# Altium footprint library Sajad_Altium_Library.PcbLib: 333 footprints (part 17 of 21)
Each footprint in its own frame and in the unit in brackets; x right, y up, seen from the top. Pads: shape width x height; smd on the part's side, far side on the other; paste and mask are expansions set on the pad; w line width, h text height; cw(c..) or ccw(c..) is an arc to the next point about the centre after c.
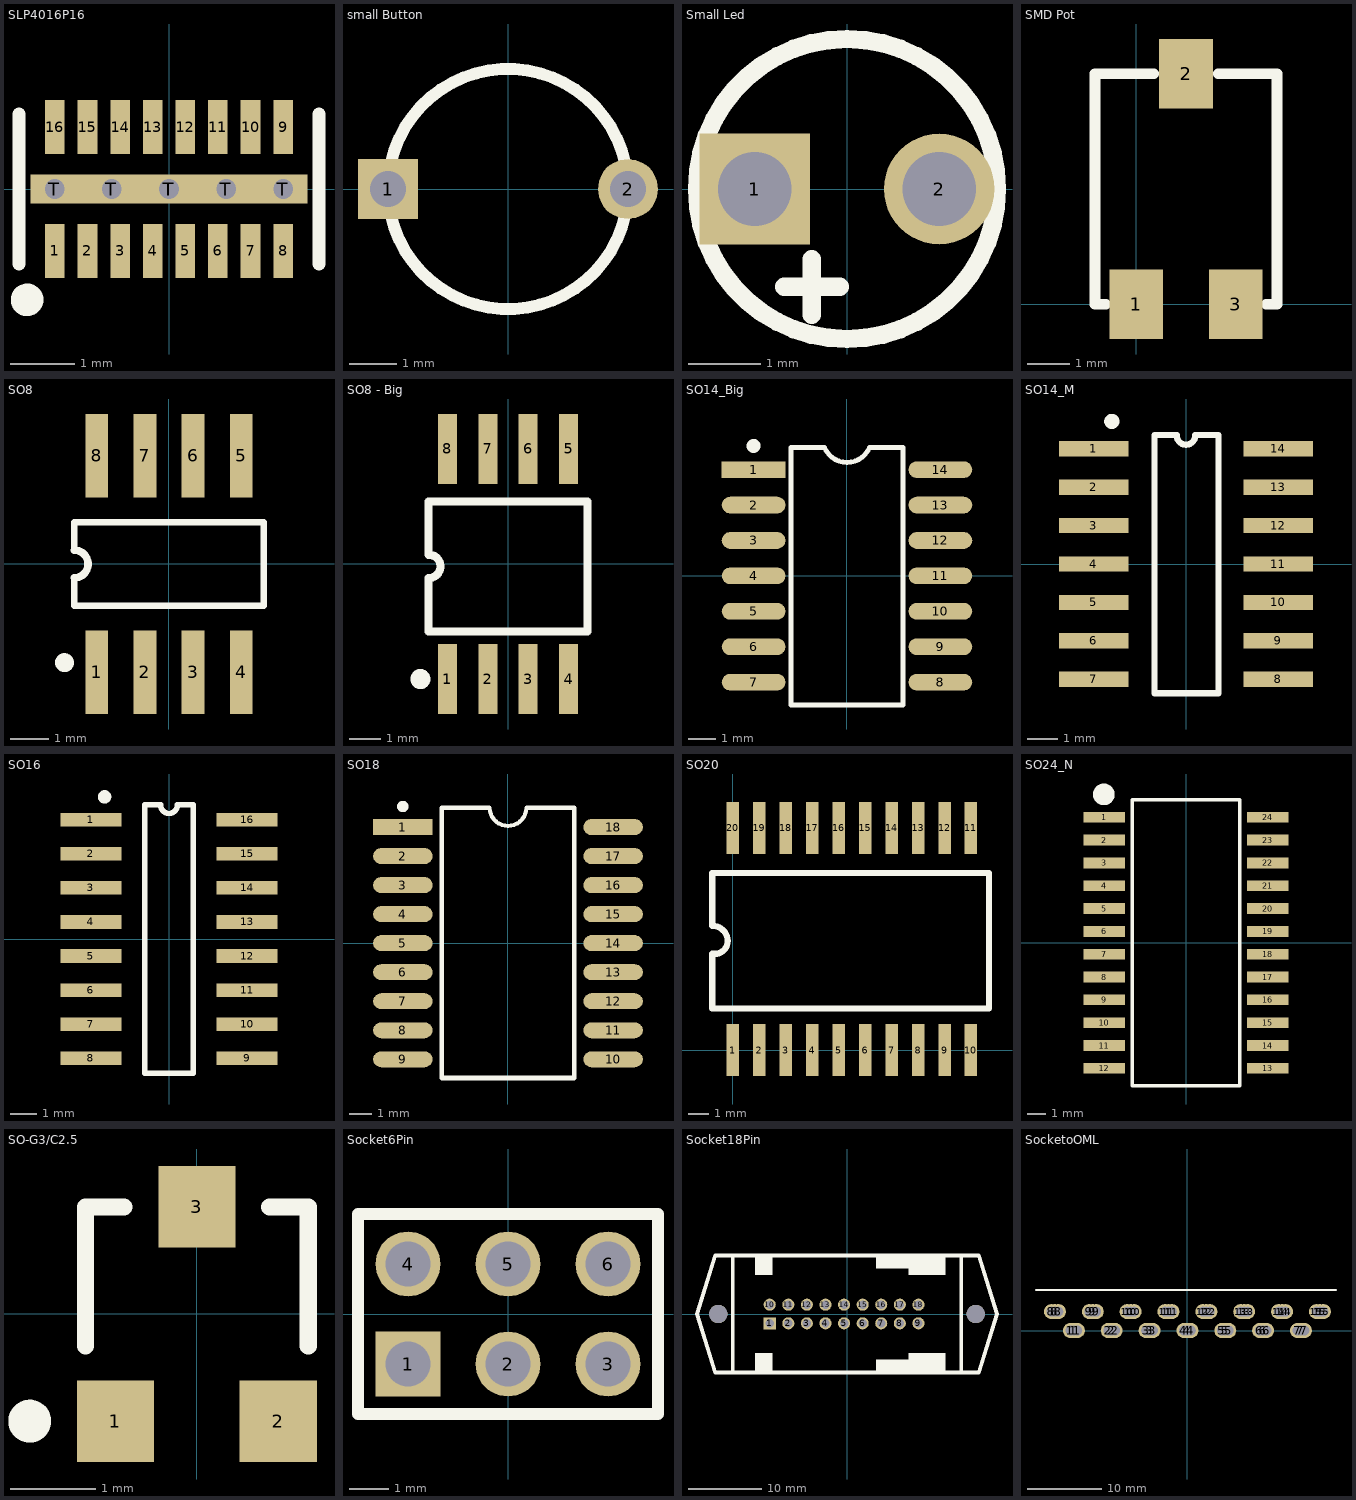
[diagram p16: the footprints below, top view; thin cyan lines are the x and y axes]

## SLP4016P16 [mil] "EClamp2410P  ESD Protection Device   for T-Flash/MicroSD Interfaces"
pads (22):
  rect 12x33 smd mask+2: 1(-70,-38) 2(-50,-38) 3(-30,-38) 4(-10,-38) 5(10,-38) 6(30,-38) 7(50,-38) 8(70,-38) 9(70,38) 10(50,38) 11(30,38) 12(10,38) 13(-10,38) 14(-30,38) 15(-50,38) 16(-70,38)
  round 15 hole 12 mask+2: T(-70,0) T(-35,0) T(0,0) T(35,0) T(70,0)
  rect 170x18 smd mask+2: T(0,0)
Top Overlay:
  circle w10: c-87,-68 r5
  lines w8: -92,-46 -92,46 ; 92,-46 92,46

## small Button [mil]
pads (2):
  rect 50x50 hole 30: 1(-100,0)
  round 50 hole 30: 2(100,0)
Top Overlay:
  circle w10: c0,0 r100
3D body: height 196.85, standoff -551.18, extent -118.1,-118.1 118.12,125.99

## Small Led [mil]
pads (2):
  rect 60x60 hole 40: 1(-50,0)
  round 60 hole 40: 2(50,0)
Top Overlay:
  circle w10: c0,0 r81.34
  lines w10: -34,-53 -3.88,-53 ; -19,-68.12 -19,-38
3D body: height 401.57, standoff -787.4, extent -64.29,-77.48 74.29,80

## SMD Pot [mil] "SMD Potentiometer"
pads (3):
  rect 50x65 smd: 1(0,0) 2(46.5,215) 3(93,0)
Top Overlay:
  lines w10: -28.5,0 -38.5,0 -38.5,215 16.5,215 ; 76.5,215 131.5,215 131.5,0 121.5,0
3D body: height 125.98, standoff -1.97, extent -32.68,-38.69 132.68,238.71

## SO8 [mm]
pads (8):
  rect 0.6x2.2 smd: 1(-1.905,-2.854) 2(-0.635,-2.854) 3(0.635,-2.854) 4(1.905,-2.854) 5(1.905,2.854) 6(0.635,2.854) 7(-0.635,2.854) 8(-1.905,2.854)
Top Overlay:
  circle w0.25: c-2.755,-2.6 r0.125
  lines w0.178: -2.5,-0.367 -2.5,-1.1 2.5,-1.1 2.5,1.1 -2.5,1.1 -2.5,0.367
  lines w0.2: -2.5,-0.367 ccw(c-2.5,0) -2.5,0.367
3D body: height 1.45, standoff 0, extent -2.464,-2.794 2.438,2.984

## SO8 - Big [mm]
pads (8):
  rect 0.6x2.2 smd: 1(-1.905,-3.619) 2(-0.635,-3.619) 3(0.635,-3.619) 4(1.905,-3.619) 5(1.905,3.619) 6(0.635,3.619) 7(-0.635,3.619) 8(-1.905,3.619)
Top Overlay:
  circle w0.381: c-2.755,-3.619 r0.125
  lines w0.254: -2.5,-0.442 -2.5,-2.119 2.5,-2.119 2.5,1.968 -2.5,1.968 -2.5,0.291 ; -2.489,-0.442 ccw(c-2.489,-0.075) -2.489,0.291
3D body: height 1.45, standoff 0, extent -2.451,-2.921 2.451,2.857

## SO14_Big [mm]
height 1.75
pads (14):
  rect 2.286x0.6 smd: 1(-3.35,3.81)
  oval 2.286x0.6 smd: 2(-3.35,2.54) 3(-3.35,1.27) 4(-3.35,0) 5(-3.35,-1.27) 6(-3.35,-2.54) 7(-3.35,-3.81) 8(3.35,-3.81) 9(3.35,-2.54) 10(3.35,-1.27) 11(3.35,0) 12(3.35,1.27) 13(3.35,2.54) 14(3.35,3.81)
Top Overlay:
  circle w0.25: c-3.35,4.66 r0.125
  lines w0.178: -2,-4.623 2,-4.623 2,4.608 0.807,4.608 cw(c0,4.935) -0.807,4.608 -2,4.608 -2,-4.623

## SO14_M [mil] "SOIC, 14-Leads, Body 8.7x3.9mm, Pitch 1.27mm, IPC Low Density"
height 68.9
pads (14):
  rect 90x20 smd: 1(-120,150) 2(-120,100) 3(-120,50) 4(-120,0) 5(-120,-50) 6(-120,-100) 7(-120,-150) 8(120,-150) 9(120,-100) 10(120,-50) 11(120,0) 12(120,50) 13(120,100) 14(120,150)
Top Overlay:
  circle w9.84: c-96.46,185.43 r4.92
  lines w7.87: -41,167.85 -41,-168 41.5,-168 ; 42,-168 42,167.85
  lines w8: -41,167.85 -12,167.85 ; -12,167 ccw(c0,167) 0,155 ccw(c0,167) 12,167 ; 12,167.85 41.5,167.85
3D body: height 69.88, standoff 0.46, extent -120.8,-171.26 120.81,171.26

## SO16 [mil]
pads (16):
  rect 90x20 smd: 1(-114.49,175) 2(-114.49,125) 3(-114.49,75) 4(-114.49,25) 5(-114.49,-25) 6(-114.49,-75) 7(-114.49,-125) 8(-114.49,-175) 9(114.49,-175) 10(114.49,-125) 11(114.49,-75) 12(114.49,-25) 13(114.49,25) 14(114.49,75) 15(114.49,125) 16(114.49,175)
Top Overlay:
  circle w9.84: c-94.49,208.46 r4.92
  lines w8: -12,196 ccw(c0,196) 12,196 ; -12,196.85 -35.43,196.85 -35.43,-196.85 35.43,-196.85 35.43,196.85 12,196.85
3D body: height 57, standoff 0, extent -117.25,-196 115.25,197

## SO18 [mm] "SOIC, 18-Leads, Body 11.6x7.5mm, Pitch 1.27mm, IPC Low Density"
height 2.65
pads (18):
  rect 2.6x0.7 smd: 1(-4.6,5.08)
  oval 2.6x0.7 smd: 2(-4.6,3.81) 3(-4.6,2.54) 4(-4.6,1.27) 5(-4.6,0) 6(-4.6,-1.27) 7(-4.6,-2.54) 8(-4.6,-3.81) 9(-4.6,-5.08) 10(4.6,-5.08) 11(4.6,-3.81) 12(4.6,-2.54) 13(4.6,-1.27) 14(4.6,0) 15(4.6,1.27) 16(4.6,2.54) 17(4.6,3.81) 18(4.6,5.08)
Top Overlay:
  circle w0.25: c-4.6,5.98 r0.125
  lines w0.178: -0.807,5.911 ccw(c0,5.938) 0.807,5.911
  lines w0.2: -2.9,5.9 -2.9,-5.9 2.9,-5.9 2.9,5.9 ; -2.896,5.918 -0.813,5.918 ; 0.813,5.918 2.896,5.918
3D body: height 2.65, standoff 0, extent -5.15,-5.765 5.15,5.765

## SO20 [mm]
pads (20):
  rect 0.6x2.5 smd: 1(0,0) 2(1.27,0) 3(2.54,0) 4(3.81,0) 5(5.08,0) 6(6.35,0) 7(7.62,0) 8(8.89,0) 9(10.16,0) 10(11.43,0) 11(11.43,10.668) 12(10.16,10.668) 13(8.89,10.668) 14(7.62,10.668) 15(6.35,10.668) 16(5.08,10.668) 17(3.81,10.668) 18(2.54,10.668) 19(1.27,10.668) 20(0,10.668)
Top Overlay:
  lines w0.3: -1,2 12.294,2 12.294,8.5 -1,8.5 ; -0.991,2.007 -0.991,4.623 -0.864,4.623 ccw(c-0.864,5.232) -0.254,5.232 ccw(c-0.991,5.232) -0.991,5.969 -0.991,8.484

## SO24_N [mm] "SOIC, 24-Leads, Body 15.4x7.5mm, Pitch 1.27mm, IPC Medium Density"
height 2.65
pads (24):
  rect 2.3x0.6 smd: 1(-4.55,6.985) 2(-4.55,5.715) 3(-4.55,4.445) 4(-4.55,3.175) 5(-4.55,1.905) 6(-4.55,0.635) 7(-4.55,-0.635) 8(-4.55,-1.905) 9(-4.55,-3.175) 10(-4.55,-4.445) 11(-4.55,-5.715) 12(-4.55,-6.985) 13(4.55,-6.985) 14(4.55,-5.715) 15(4.55,-4.445) 16(4.55,-3.175) 17(4.55,-1.905) 18(4.55,-0.635) 19(4.55,0.635) 20(4.55,1.905) 21(4.55,3.175) 22(4.55,4.445) 23(4.55,5.715) 24(4.55,6.985)
Top Overlay:
  circle w0.6: c-4.572,8.255 r0.3
  lines w0.2: -3,-7.95 3,-7.95 3,7.95 -3,7.95 -3,-7.95

## SO-G3/C2.5 [mm]
height 1.12
pads (3):
  rect 0.9x0.95 smd: 1(-0.95,-1.25) 2(0.95,-1.25) 3(0,1.25)
Top Overlay:
  circle w0.25: c-1.95,-1.25 r0.125
  lines w0.2: -1.3,-0.375 -1.3,1.25 -0.85,1.25 ; 0.85,1.25 1.3,1.25 1.3,-0.375

## Socket6Pin [mil] "for Dena & Samand Mirror"
height 372.05
pads (6):
  rect 65x65 hole 45: 1(-100,-50)
  round 65 hole 45: 2(0,-50) 3(100,-50) 4(-100,50) 5(0,50) 6(100,50)
Top Overlay:
  lines w12: -150,-100 150,-100 150,100 -150,100 -150,-100

## Socket18Pin [mm] "for Dena & Samand Door"
height 9.45
pads (20):
  rect 1.65x1.65 hole 1.143: 1(-10.56,-1.27)
  round 1.65 hole 1.143: 2(-8.02,-1.27) 3(-5.48,-1.27) 4(-2.94,-1.27) 5(-0.4,-1.27) 6(2.14,-1.27) 7(4.68,-1.27) 8(7.22,-1.27) 9(9.76,-1.27) 10(-10.56,1.27) 11(-8.02,1.27) 12(-5.48,1.27) 13(-2.94,1.27) 14(-0.4,1.27) 15(2.14,1.27) 16(4.68,1.27) 17(7.22,1.27) 18(9.76,1.27)
  round 2.5 hole 2.5: ""(-17.6,0) ""(17.6,0)
Top Overlay:
  region: -10.211,-5.3 -12.6,-5.3 -12.6,-8 -10.211,-8
  region: 8.437,-6.252 3.962,-6.252 3.962,-7.979 8.437,-7.979
  rectangle: 8.437,-7.979 13.437,-5.3
  rectangle: 8.437,5.3 13.437,7.979
  region: 8.437,7.979 3.962,7.979 3.962,6.252 8.437,6.252
  region: -10.211,8 -12.6,8 -12.6,5.3 -10.211,5.3
  lines w0.5: -15.6,-8 -15.6,8 ; 15.6,-8 15.6,8 ; -20.5,0 -18,8 18,8 20.5,0 18,-8 -18,-8 -20.5,0

## SocketoOML [mil]
pads (45):
  round 80 hole 50: 1(-618.15,0) 1(-600,0) 1(-581.85,0) 2(-418.15,0) 2(-400,0) 2(-381.85,0) 3(-218.15,0) 3(-200,0) 3(-181.85,0) 4(-18.15,0) 4(0,0) 4(18.15,0) 5(181.85,0) 5(200,0) 5(218.15,0) 6(381.85,0) 6(400,0) 6(418.15,0) 7(581.85,0) 7(600,0) 7(618.15,0) 8(-718.15,100) 8(-700,100) 8(-681.85,100) 9(-518.15,100) 9(-500,100) 9(-481.85,100) 10(-318.15,100) 10(-300,100) 10(-281.85,100) 11(-118.15,100) 11(-100,100) 11(-81.85,100) 12(81.85,100) 12(100,100) 12(118.15,100) 13(281.85,100) 13(300,100) 13(318.15,100) 14(481.85,100) 14(500,100) 14(518.15,100) 15(681.85,100) 15(700,100) 15(718.15,100)
Top Overlay:
  lines w10: -800,215 785,215